# Altium integrated library LEMO Unipole And Multipole Type Connectors.IntLib: 1566 symbols (part 7 of 13) (continued)
## HEW.LF.368.XLNP
designator J?
Fixed receptacle, nut fixing for printed circuit, Key (W), LF series, Multipole Type with; Manufacturer: LEMO; PartNumber: HEW.LF.368.XLNP; Number of contacts: 0; Contact Diameter: 0.7 mm; Test voltage Contact-Contact(Kv rms): 1.5; Rate Current(A): 2.5; DatasheetVersion: Jun-14; PackageReference: HEW.LF.368.XLNP; PackageDescription: Fixed receptacle, nut fixing for printed circuit, watertight, Key(W) for Printed Circuit; Supplier 1: Mouser; Supplier Part Number 1: 736-HEWLF368XLNP; Supplier 2: Digi-Key; Supplier Part Number 2: HEW.LF.368.XLNP-ND; Test voltage Contact-Shell(Kv rms): 1.5; ComponentLink1Description: Manufacturer URL; ComponentLink1URL: http://www.lemo.com; ComponentLink2Description: Datasheet; ComponentLink2URL: http://intra.lemo.ch/catalog/ROW/UK_English/f_series.pdf
footprint HEW.LF.368.XLNP (Socket, Female, Through hole)
part A pins: 1, 2, 3, 4, 5, 6, 7, 8, 9, 10, 11, 12, 13, 14, 15, 16, 17, 18, 19, 20, 21, 22, 23, 24, 25, 26, 27, 28, 29, 30, 31, 32, 33, 34
part B pins: 35, 36, 37, 38, 39, 40, 41, 42, 43, 44, 45, 46, 47, 48, 49, 50, 51, 52, 53, 54, 55, 56, 57, 58, 59, 60, 61, 62, 63, 64, 65, 66, 67, 68, 70, 71, 72, 73

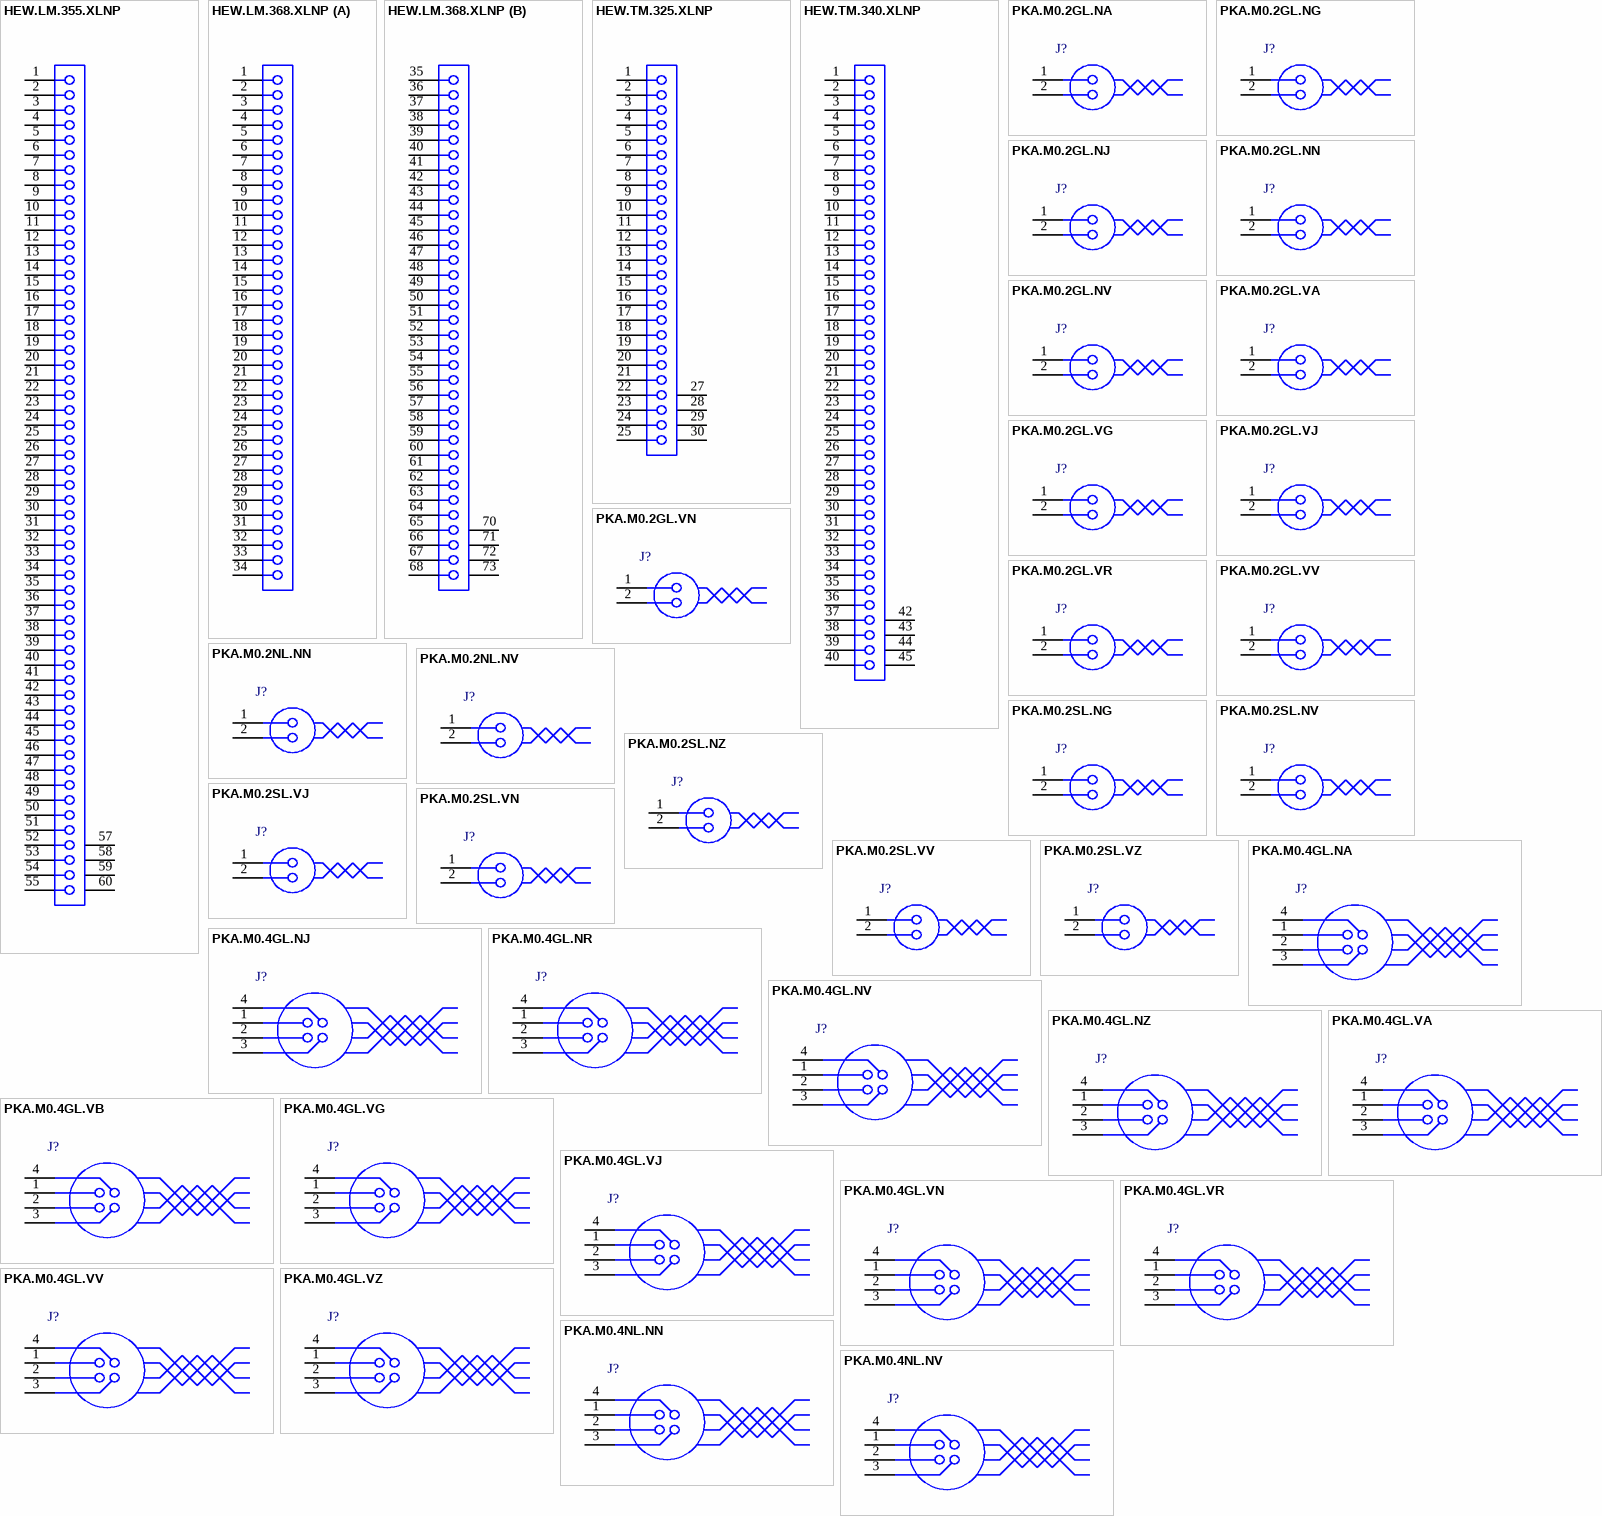
[diagram p23: symbols HEW.LM.355.XLNP to PKA.M0.4NL.NV]

## HEW.LM.355.XLNP
designator J?
Fixed receptacle, nut fixing for printed circuit, watertight, Key (W), LM series, Multipole Type with; Manufacturer: LEMO; PartNumber: HEW.LM.355.XLNP; Number of contacts: 0; Contact Diameter: 0.9 mm; Rated Current(A): 3.5; DatasheetVersion: Jun-14; PackageReference: HEW.LM.355.XLNP; PackageDescription: Fixed receptacle, nut fixing for printed circuit, watertight, Key(W) for Printed Circuit; Supplier 1: Mouser; Supplier Part Number 1: 736-HEWLM355XLNP; Supplier 2: Digi-Key; Supplier Part Number 2: HEW.LM.355.XLNP-ND; ComponentLink1Description: Manufacturer URL; ComponentLink1URL: http://www.lemo.com; ComponentLink2Description: Datasheet; ComponentLink2URL: http://intra.lemo.ch/catalog/ROW/UK_English/M_series.pdf
footprint HEW.LM.355.XLNP (Socket, Female, Body 28mm dia. Height 24.6 mm, Through hole)
pins: 1, 2, 3, 4, 5, 6, 7, 8, 9, 10, 11, 12, 13, 14, 15, 16, 17, 18, 19, 20, 21, 22, 23, 24, 25, 26, 27, 28, 29, 30, 31, 32, 33, 34, 35, 36, 37, 38, 39, 40, 41, 42, 43, 44, 45, 46, 47, 48, 49, 50, 51, 52, 53, 54, 55, 57, 58, 59, 60

## HEW.LM.368.XLNP
designator J?
Fixed receptacle, nut fixing for printed circuit, watertight, Key (W), LM series, Multipole Type with; Manufacturer: LEMO; PartNumber: HEW.LM.368.XLNP; Number of contacts: 0; Contact Diameter: 0.7 mm; AWG: 24; Rated Current(A): 2.5; DatasheetVersion: Jun-14; PackageReference: HEW.LM.368.XLNP; PackageDescription: Fixed receptacle, nut fixing for printed circuit, watertight, Key(W) for Printed Circuit; Supplier 1: Mouser; Supplier Part Number 1: 736-HEWLM368XLNP; Supplier 2: Digi-Key; Supplier Part Number 2: 1124-1201-ND; ComponentLink1Description: Manufacturer URL; ComponentLink1URL: http://www.lemo.com; ComponentLink2Description: Datasheet; ComponentLink2URL: http://intra.lemo.ch/catalog/ROW/UK_English/M_series.pdf
footprint HEW.LM.368.XLNP (Socket, Female, Body 28mm dia. Height 24.6 mm, Through hole)
part A pins: 1, 2, 3, 4, 5, 6, 7, 8, 9, 10, 11, 12, 13, 14, 15, 16, 17, 18, 19, 20, 21, 22, 23, 24, 25, 26, 27, 28, 29, 30, 31, 32, 33, 34
part B pins: 35, 36, 37, 38, 39, 40, 41, 42, 43, 44, 45, 46, 47, 48, 49, 50, 51, 52, 53, 54, 55, 56, 57, 58, 59, 60, 61, 62, 63, 64, 65, 66, 67, 68, 70, 71, 72, 73

## HEW.TM.325.XLNP
designator J?
Fixed receptacle, nut fixing for printed circuit, watertight, Key (W), TM series, Multipole Type with 25 Contacts; Manufacturer: LEMO; PartNumber: HEW.TM.325.XLNP; Number of contacts: 25; Contact Diameter: 0.9 mm; Rated Current(A): 5; DatasheetVersion: Jun-14; PackageReference: HEW.TM.325.XLNP; PackageDescription: Fixed receptacle, nut fixing for printed circuit, watertight, Key(W) for Printed Circuit; ComponentLink1Description: Manufacturer URL; ComponentLink1URL: http://www.lemo.com; ComponentLink2Description: Datasheet; ComponentLink2URL: http://intra.lemo.ch/catalog/ROW/UK_English/M_series.pdf
footprint HEW.TM.325.XLNP (Socket, Female, Body 22mm dia. Height 24.6 mm, Through hole)
pins: 1, 2, 3, 4, 5, 6, 7, 8, 9, 10, 11, 12, 13, 14, 15, 16, 17, 18, 19, 20, 21, 22, 23, 24, 25, 27, 28, 29, 30

## HEW.TM.340.XLNP
designator J?
Fixed receptacle, nut fixing for printed circuit, watertight, Key (W), TM series, Multipole Type with 40 Contacts; Manufacturer: LEMO; PartNumber: HEW.TM.340.XLNP; Number of contacts: 40; Contact Diameter: 0.7 mm; Rated Current(A): 3; DatasheetVersion: Jun-14; PackageReference: HEW.TM.340.XLNP; PackageDescription: Fixed receptacle, nut fixing for printed circuit, watertight, Key(W) for Printed Circuit; Supplier 1: Mouser; Supplier Part Number 1: 736-HEWTM340XLNP; Supplier 2: Digi-Key; Supplier Part Number 2: HEW.TM.340.XLNP-ND; ComponentLink1Description: Manufacturer URL; ComponentLink1URL: http://www.lemo.com; ComponentLink2Description: Datasheet; ComponentLink2URL: http://intra.lemo.ch/catalog/ROW/UK_English/M_series.pdf
footprint HEW.TM.340.XLNP (Socket, Female, Body 22mm dia. Height 24.6 mm, Through hole)
pins: 1, 2, 3, 4, 5, 6, 7, 8, 9, 10, 11, 12, 13, 14, 15, 16, 17, 18, 19, 20, 21, 22, 23, 24, 25, 26, 27, 28, 29, 30, 31, 32, 33, 34, 35, 36, 37, 38, 39, 40, 42, 43, 44, 45

## PKA.M0.2GL.NA
designator J?
Fixed receptacle with two nuts (back panel mounting), straight print contacts, Key (A), P series, Multipole Type with 2 Contacts; Manufacturer: LEMO; PartNumber: PKA.M0.2GL.NA; Number of contacts: 2; Contact Diameter: 1.3 mm; Test voltage (kV rms) Contact-Contact: 1.2; Rated Current(A): 10; DatasheetVersion: Jun-14; PackageReference: PKA.M0.2GL.NA; PackageDescription: Fixed receptacle with two nuts (back panel mounting), straight print contacts, Key(A) for Printed Circuit; ComponentLink1Description: Manufacturer URL; ComponentLink1URL: http://www.lemo.com; ComponentLink2Description: Datasheet; ComponentLink2URL: http://intra.lemo.ch/catalog/ROW/UK_English/P_series_catalog.pdf
footprint PKA.M0.2GL.NA (Socket, Female, Height 33.5 mm, Through hole)
pins: 1, 2

## PKA.M0.2GL.NG
designator J?
Fixed receptacle with two nuts (back panel mounting), straight print contacts, Key (A), P series, Multipole Type with 2 Contacts; Manufacturer: LEMO; PartNumber: PKA.M0.2GL.NG; Number of contacts: 2; Contact Diameter: 1.3 mm; Test voltage (kV rms) Contact-Contact: 1.2; Rated Current(A): 10; DatasheetVersion: Jun-14; PackageReference: PKA.M0.2GL.NG; PackageDescription: Fixed receptacle with two nuts (back panel mounting), straight print contacts, Key(A) for Printed Circuit; ComponentLink1Description: Manufacturer URL; ComponentLink1URL: http://www.lemo.com; ComponentLink2Description: Datasheet; ComponentLink2URL: http://intra.lemo.ch/catalog/ROW/UK_English/P_series_catalog.pdf
footprint PKA.M0.2GL.NG (Socket, Female, Height 33.5 mm, Through hole)
pins: 1, 2

## PKA.M0.2GL.NJ
designator J?
Fixed receptacle with two nuts (back panel mounting), straight print contacts, Key (A), P series, Multipole Type with 2 Contacts; Manufacturer: LEMO; PartNumber: PKA.M0.2GL.NJ; Number of contacts: 2; Contact Diameter: 1.3 mm; Test voltage (kV rms) Contact-Contact: 1.2; Rated Current(A): 10; DatasheetVersion: Jun-14; PackageReference: PKA.M0.2GL.NJ; PackageDescription: Fixed receptacle with two nuts (back panel mounting), straight print contacts, Key(A) for Printed Circuit; ComponentLink1Description: Manufacturer URL; ComponentLink1URL: http://www.lemo.com; ComponentLink2Description: Datasheet; ComponentLink2URL: http://intra.lemo.ch/catalog/ROW/UK_English/P_series_catalog.pdf
footprint PKA.M0.2GL.NJ (Socket, Female, Height 33.5 mm, Through hole)
pins: 1, 2

## PKA.M0.2GL.NN
designator J?
Fixed receptacle with two nuts (back panel mounting), straight print contacts, Key (A), P series, Multipole Type with 2 Contacts; Manufacturer: LEMO; PartNumber: PKA.M0.2GL.NN; Number of contacts: 2; Contact Diameter: 1.3 mm; Test voltage (kV rms) Contact-Contact: 1.2; Rated Current(A): 10; DatasheetVersion: Jun-14; PackageReference: PKA.M0.2GL.NN; PackageDescription: Fixed receptacle with two nuts (back panel mounting), straight print contacts, Key(A) for Printed Circuit; ComponentLink1Description: Manufacturer URL; ComponentLink1URL: http://www.lemo.com; ComponentLink2Description: Datasheet; ComponentLink2URL: http://intra.lemo.ch/catalog/ROW/UK_English/P_series_catalog.pdf
footprint PKA.M0.2GL.NN (Socket, Female, Height 33.5 mm, Through hole)
pins: 1, 2

## PKA.M0.2GL.NV
designator J?
Fixed receptacle with two nuts (back panel mounting), straight print contacts, Key (A),  series, Multipole Type with 2 Contacts; Manufacturer: LEMO; PartNumber: PKA.M0.2GL.NV; Number of contacts: 2; Contact Diameter: 1.3 mm; Test voltage (kV rms) Contact-Contact: 1.2; Rated Current(A): 10; DatasheetVersion: Jun-14; PackageReference: PKA.M0.2GL.NV; PackageDescription: Fixed receptacle with two nuts (back panel mounting), straight print contacts, Key(A) for Printed Circuit; ComponentLink1Description: Manufacturer URL; ComponentLink1URL: http://www.lemo.com; ComponentLink2Description: Datasheet; ComponentLink2URL: http://intra.lemo.ch/catalog/ROW/UK_English/P_series_catalog.pdf
footprint PKA.M0.2GL.NV (Socket, Female, Height 33.5 mm, Through hole)
pins: 1, 2

## PKA.M0.2GL.VA
designator J?
Fixed receptacle with two nuts (back panel mounting), 90° print contacts, Key (A), P series, Multipole Type with 2 Contacts; Manufacturer: LEMO; PartNumber: PKA.M0.2GL.VA; Number of contacts: 2; Contact Diameter: 1.3 mm; Test voltage (kV rms) Contact-Contact: 1.2; Rated Current(A): 10; DatasheetVersion: Jun-14; PackageReference: PKA.M0.2GL.VA; PackageDescription: Fixed receptacle with two nuts (back panel mounting), 90° print contacts, Key(A) for Printed Circuit; ComponentLink1Description: Manufacturer URL; ComponentLink1URL: http://www.lemo.com; ComponentLink2Description: Datasheet; ComponentLink2URL: http://intra.lemo.ch/catalog/ROW/UK_English/P_series_catalog.pdf
footprint PKA.M0.2GL.VA (Socket, Female, Height 33.5 mm, Through hole)
pins: 1, 2

## PKA.M0.2GL.VG
designator J?
Fixed receptacle with two nuts (back panel mounting), 90° print contacts, Key (A), P series, Multipole Type with 2 Contacts; Manufacturer: LEMO; PartNumber: PKA.M0.2GL.VG; Number of contacts: 2; Contact Diameter: 1.3 mm; Test voltage (kV rms) Contact-Contact: 1.2; Rated Current(A): 10; DatasheetVersion: Jun-14; PackageReference: PKA.M0.2GL.VG; PackageDescription: Fixed receptacle with two nuts (back panel mounting), 90° print contacts, Key(A) for Printed Circuit; ComponentLink1Description: Manufacturer URL; ComponentLink1URL: http://www.lemo.com; ComponentLink2Description: Datasheet; ComponentLink2URL: http://intra.lemo.ch/catalog/ROW/UK_English/P_series_catalog.pdf
footprint PKA.M0.2GL.VG (Socket, Female, Height 33.5 mm, Through hole)
pins: 1, 2

## PKA.M0.2GL.VJ
designator J?
Fixed receptacle with two nuts (back panel mounting), 90° print contacts, Key (A), P series, Multipole Type with 2 Contacts; Manufacturer: LEMO; PartNumber: PKA.M0.2GL.VJ; Number of contacts: 2; Contact Diameter: 1.3 mm; Test voltage (kV rms) Contact-Contact: 1.2; Rated Current(A): 10; DatasheetVersion: Jun-14; PackageReference: PKA.M0.2GL.VJ; PackageDescription: Fixed receptacle with two nuts (back panel mounting), 90° print contacts, Key(A) for Printed Circuit; ComponentLink1Description: Manufacturer URL; ComponentLink1URL: http://www.lemo.com; ComponentLink2Description: Datasheet; ComponentLink2URL: http://intra.lemo.ch/catalog/ROW/UK_English/P_series_catalog.pdf
footprint PKA.M0.2GL.VJ (Socket, Female, Height 33.5 mm, Through hole)
pins: 1, 2

## PKA.M0.2GL.VN
designator J?
Fixed receptacle with two nuts (back panel mounting), 90° print contacts, Key (A), P series, Multipole Type with 2 Contacts; Manufacturer: LEMO; PartNumber: PKA.M0.2GL.VN; Number of contacts: 2; Contact Diameter: 1.3 mm; Test voltage (kV rms) Contact-Contact: 1.2; Rated Current(A): 10; DatasheetVersion: Jun-14; PackageReference: PKA.M0.2GL.VN; PackageDescription: Fixed receptacle with two nuts (back panel mounting), 90° print contacts, Key(A) for Printed Circuit; ComponentLink1Description: Manufacturer URL; ComponentLink1URL: http://www.lemo.com; ComponentLink2Description: Datasheet; ComponentLink2URL: http://intra.lemo.ch/catalog/ROW/UK_English/P_series_catalog.pdf
footprint PKA.M0.2GL.VN (Socket, Female, Height 33.5 mm, Through hole)
pins: 1, 2

## PKA.M0.2GL.VR
designator J?
Fixed receptacle with two nuts (back panel mounting), 90° print contacts, Key (A), P series, Multipole Type with 2 Contacts; Manufacturer: LEMO; PartNumber: PKA.M0.2GL.VR; Number of contacts: 2; Contact Diameter: 1.3 mm; Test voltage (kV rms) Contact-Contact: 1.2; Rated Current(A): 10; DatasheetVersion: Jun-14; PackageReference: PKA.M0.2GL.VR; PackageDescription: Fixed receptacle with two nuts (back panel mounting), 90° print contacts, Key(A) for Printed Circuit; ComponentLink1Description: Manufacturer URL; ComponentLink1URL: http://www.lemo.com; ComponentLink2Description: Datasheet; ComponentLink2URL: http://intra.lemo.ch/catalog/ROW/UK_English/P_series_catalog.pdf
footprint PKA.M0.2GL.VR (Socket, Female, Height 33.5 mm, Through hole)
pins: 1, 2

## PKA.M0.2GL.VV
designator J?
Fixed receptacle with two nuts (back panel mounting), 90° print contacts, Key (A), P series, Multipole Type with 2 Contacts; Manufacturer: LEMO; PartNumber: PKA.M0.2GL.VV; Number of contacts: 2; Contact Diameter: 1.3 mm; Test voltage (kV rms) Contact-Contact: 1.2; Rated Current(A): 10; DatasheetVersion: Jun-14; PackageReference: PKA.M0.2GL.VV; PackageDescription: Fixed receptacle with two nuts (back panel mounting), 90° print contacts, Key(A) for Printed Circuit; ComponentLink1Description: Manufacturer URL; ComponentLink1URL: http://www.lemo.com; ComponentLink2Description: Datasheet; ComponentLink2URL: http://intra.lemo.ch/catalog/ROW/UK_English/P_series_catalog.pdf
footprint PKA.M0.2GL.VV (Socket, Female, Height 33.5 mm, Through hole)
pins: 1, 2

## PKA.M0.2NL.NN
designator J?
Fixed receptacle with two nuts (back panel mounting), straight print contacts, Key (A), P series, Multipole Type with 2 Contacts; Manufacturer: LEMO; PartNumber: PKA.M0.2NL.NN; Number of contacts: 2; Contact Diameter: 1.3 mm; Test voltage (kV rms) Contact-Contact: 1.2; Rated Current(A): 10; DatasheetVersion: Jun-14; PackageReference: PKA.M0.2NL.NN; PackageDescription: Fixed receptacle with two nuts (back panel mounting), straight print contacts, Key(A) for Printed Circuit; ComponentLink1Description: Manufacturer URL; ComponentLink1URL: http://www.lemo.com; ComponentLink2Description: Datasheet; ComponentLink2URL: http://intra.lemo.ch/catalog/ROW/UK_English/P_series_catalog.pdf
footprint PKA.M0.2NL.NN (Socket, Female, Height 33.5 mm, Through hole)
pins: 1, 2

## PKA.M0.2NL.NV
designator J?
Fixed receptacle with two nuts (back panel mounting), straight print contacts, Key (A), P series, Multipole Type with 2 Contacts; Manufacturer: LEMO; PartNumber: PKA.M0.2NL.NV; Number of contacts: 2; Contact Diameter: 1.3 mm; Test voltage (kV rms) Contact-Contact: 1.2; Rated Current(A): 10; DatasheetVersion: Jun-14; PackageReference: PKA.M0.2NL.NV; PackageDescription: Fixed receptacle with two nuts (back panel mounting), straight print contacts, Key(A) for Printed Circuit; ComponentLink1Description: Manufacturer URL; ComponentLink1URL: http://www.lemo.com; ComponentLink2Description: Datasheet; ComponentLink2URL: http://intra.lemo.ch/catalog/ROW/UK_English/P_series_catalog.pdf
footprint PKA.M0.2NL.NV (Socket, Female, Height 33.5 mm, Through hole)
pins: 1, 2

## PKA.M0.2SL.NG
designator J?
Fixed receptacle with two nuts (back panel mounting), straight print contacts, Key (A), P series, Multipole Type with 2 Contacts; Manufacturer: LEMO; PartNumber: PKA.M0.2SL.NG; Number of contacts: 2; Contact Diameter: 1.3 mm; Test voltage (kV rms) Contact-Contact: 1.2; Rated Current(A): 10; DatasheetVersion: Jun-14; PackageReference: PKA.M0.2SL.NG; PackageDescription: Fixed receptacle with two nuts (back panel mounting), straight print contacts, Key(A) for Printed Circuit; ComponentLink1Description: Manufacturer URL; ComponentLink1URL: http://www.lemo.com; ComponentLink2Description: Datasheet; ComponentLink2URL: http://intra.lemo.ch/catalog/ROW/UK_English/P_series_catalog.pdf
footprint PKA.M0.2SL.NG (Socket, Female, Height 33.5 mm, Through hole)
pins: 1, 2

## PKA.M0.2SL.NV
designator J?
Fixed receptacle with two nuts (back panel mounting), straight print contacts, Key (A), P series, Multipole Type with 2 Contacts; Manufacturer: LEMO; PartNumber: PKA.M0.2SL.NV; Number of contacts: 2; Contact Diameter: 1.3 mm; Test voltage (kV rms) Contact-Contact: 1.2; Rated Current(A): 10; DatasheetVersion: Jun-14; PackageReference: PKA.M0.2SL.NV; PackageDescription: Fixed receptacle with two nuts (back panel mounting), straight print contacts, Key(A) for Printed Circuit; ComponentLink1Description: Manufacturer URL; ComponentLink1URL: http://www.lemo.com; ComponentLink2Description: Datasheet; ComponentLink2URL: http://intra.lemo.ch/catalog/ROW/UK_English/P_series_catalog.pdf
footprint PKA.M0.2SL.NV (Socket, Female, Height 33.5 mm, Through hole)
pins: 1, 2

## PKA.M0.2SL.NZ
designator J?
Fixed receptacle with 1 nut (without 2nd front nut), Key (A), P series, Multipole Type with 2 Contacts; Manufacturer: LEMO; PartNumber: PKA.M0.2SL.NZ; Number of contacts: 2; Contact Diameter: 1.3 mm; Test voltage (kV rms) Contact-Contact: 1.2; Rated Current(A): 10; DatasheetVersion: Jun-14; PackageReference: PKA.M0.2SL.NZ; PackageDescription: Fixed receptacle with 1 nut (without 2nd front nut), Key(A) for Printed Circuit; Supplier 1: Mouser; Supplier Part Number 1: 736-PKAM02SLNZ; Supplier 2: Digi-Key; Supplier Part Number 2: PKA.M0.2SL.NZ-ND; ComponentLink1Description: Manufacturer URL; ComponentLink1URL: http://www.lemo.com; ComponentLink2Description: Datasheet; ComponentLink2URL: http://intra.lemo.ch/catalog/ROW/UK_English/P_series_catalog.pdf
footprint PKA.M0.2SL.NZ (Socket, Female, Height 25 mm, Through hole)
pins: 1, 2

## PKA.M0.2SL.VJ
designator J?
Fixed receptacle with two nuts (back panel mounting), 90° print contacts, Key (A), P series, Multipole Type with 2 Contacts; Manufacturer: LEMO; PartNumber: PKA.M0.2SL.VJ; Number of contacts: 2; Contact Diameter: 1.3 mm; Test voltage (kV rms) Contact-Contact: 1.2; Rated Current(A): 10; DatasheetVersion: Jun-14; PackageReference: PKA.M0.2SL.VJ; PackageDescription: Fixed receptacle with two nuts (back panel mounting), 90° print contacts, Key(A) for Printed Circuit; ComponentLink1Description: Manufacturer URL; ComponentLink1URL: http://www.lemo.com; ComponentLink2Description: Datasheet; ComponentLink2URL: http://intra.lemo.ch/catalog/ROW/UK_English/P_series_catalog.pdf
footprint PKA.M0.2SL.VJ (Socket, Female, Through hole)
pins: 1, 2

## PKA.M0.2SL.VN
designator J?
Fixed receptacle with two nuts (back panel mounting), 90° print contacts, Key (A), P series, Multipole Type with 2 Contacts; Manufacturer: LEMO; PartNumber: PKA.M0.2SL.VN; Number of contacts: 2; Contact Diameter: 1.3 mm; Test voltage (kV rms) Contact-Contact: 1.2; Rated Current(A): 10; DatasheetVersion: Jun-14; PackageReference: PKA.M0.2SL.VN; PackageDescription: Fixed receptacle with two nuts (back panel mounting), 90° print contacts, Key(A) for Printed Circuit; Supplier 1: Mouser; Supplier Part Number 1: 736-PKAM02SLVN; Supplier 2: Digi-Key; Supplier Part Number 2: PKA.M0.2SL.VN-ND; ComponentLink1Description: Manufacturer URL; ComponentLink1URL: http://www.lemo.com; ComponentLink2Description: Datasheet; ComponentLink2URL: http://intra.lemo.ch/catalog/ROW/UK_English/P_series_catalog.pdf
footprint PKA.M0.2SL.VN (Socket, Female, Height 33.5 mm, Through hole)
pins: 1, 2

## PKA.M0.2SL.VV
designator J?
Fixed receptacle with two nuts (back panel mounting), 90° print contacts, Key (A), P series, Multipole Type with 2 Contacts; Manufacturer: LEMO; PartNumber: PKA.M0.2SL.VV; Number of contacts: 2; Contact Diameter: 1.3 mm; Test voltage (kV rms) Contact-Contact: 1.2; Rated Current(A): 10; DatasheetVersion: Jun-14; PackageReference: PKA.M0.2SL.VV; PackageDescription: Fixed receptacle with two nuts (back panel mounting), 90° print contacts, Key(A) for Printed Circuit; ComponentLink1Description: Manufacturer URL; ComponentLink1URL: http://www.lemo.com; ComponentLink2Description: Datasheet; ComponentLink2URL: http://intra.lemo.ch/catalog/ROW/UK_English/P_series_catalog.pdf
footprint PKA.M0.2SL.VV (Socket, Female, Height 33.5 mm, Through hole)
pins: 1, 2

## PKA.M0.2SL.VZ
designator J?
Fixed receptacle with 1 nut (without 2nd front nut), Key (A), P series, Multipole Type with 2 Contacts; Manufacturer: LEMO; PartNumber: PKA.M0.2SL.VZ; Number of contacts: 2; Contact Diameter: 1.3 mm; Test voltage (kV rms) Contact-Contact: 1.2; Rated Current(A): 10; DatasheetVersion: Jun-14; PackageReference: PKA.M0.2SL.VZ; PackageDescription: Fixed receptacle with 1 nut (without 2nd front nut), Key(A) for Printed Circuit; ComponentLink1Description: Manufacturer URL; ComponentLink1URL: http://www.lemo.com; ComponentLink2Description: Datasheet; ComponentLink2URL: http://intra.lemo.ch/catalog/ROW/UK_English/P_series_catalog.pdf
footprint PKA.M0.2SL.VZ (Socket, Female, Height 33.5 mm, Through hole)
pins: 1, 2

## PKA.M0.4GL.NA
designator J?
Fixed receptacle with two nuts (back panel mounting), straight print contacts, Key (A), P series, Multipole Type with 4 Contacts; Manufacturer: LEMO; PartNumber: PKA.M0.4GL.NA; Number of contacts: 4; Contact Diameter: 0.9 mm; Test voltage (kV rms) Contact-Contact: 1.2; Rated Current(A): 8; DatasheetVersion: Jun-14; PackageReference: PKA.M0.4GL.NA; PackageDescription: Fixed receptacle with two nuts (back panel mounting), straight print contacts, Key(A) for Printed Circuit; ComponentLink1Description: Manufacturer URL; ComponentLink1URL: http://www.lemo.com; ComponentLink2Description: Datasheet; ComponentLink2URL: http://intra.lemo.ch/catalog/ROW/UK_English/P_series_catalog.pdf
footprint PKA.M0.4GL.NA (Socket, Female, Height 33.5 mm, Through hole)
pins: 1, 2, 3, 4

## PKA.M0.4GL.NJ
designator J?
Fixed receptacle with two nuts (back panel mounting), straight print contacts, Key (A), P series, Multipole Type with 4 Contacts; Manufacturer: LEMO; PartNumber: PKA.M0.4GL.NJ; Number of contacts: 4; Contact Diameter: 0.9 mm; Test voltage (kV rms) Contact-Contact: 1.2; Rated Current(A): 8; DatasheetVersion: Jun-14; PackageReference: PKA.M0.4GL.NJ; PackageDescription: Fixed receptacle with two nuts (back panel mounting), straight print contacts, Key(A) for Printed Circuit; ComponentLink1Description: Manufacturer URL; ComponentLink1URL: http://www.lemo.com; ComponentLink2Description: Datasheet; ComponentLink2URL: http://intra.lemo.ch/catalog/ROW/UK_English/P_series_catalog.pdf
footprint PKA.M0.4GL.NJ (Socket, Female, Height 33.5 mm, Through hole)
pins: 1, 2, 3, 4

## PKA.M0.4GL.NR
designator J?
Fixed receptacle with two nuts (back panel mounting), straight print contacts, Key (A), P series, Multipole Type with 4 Contacts; Manufacturer: LEMO; PartNumber: PKA.M0.4GL.NR; Number of contacts: 4; Contact Diameter: 0.9 mm; Test voltage (kV rms) Contact-Contact: 1.2; Rated Current(A): 8; DatasheetVersion: Jun-14; PackageReference: PKA.M0.4GL.NR; PackageDescription: Fixed receptacle with two nuts (back panel mounting), straight print contacts, Key(A) for Printed Circuit; ComponentLink1Description: Manufacturer URL; ComponentLink1URL: http://www.lemo.com; ComponentLink2Description: Datasheet; ComponentLink2URL: http://intra.lemo.ch/catalog/ROW/UK_English/P_series_catalog.pdf
footprint PKA.M0.4GL.NR (Socket, Female, Height 33.5 mm, Through hole)
pins: 1, 2, 3, 4

## PKA.M0.4GL.NV
designator J?
Fixed receptacle with two nuts (back panel mounting), straight print contacts, Key (A), P series, Multipole Type with 4 Contacts; Manufacturer: LEMO; PartNumber: PKA.M0.4GL.NV; Number of contacts: 4; Contact Diameter: 0.9 mm; Test voltage (kV rms) Contact-Contact: 1.2; Rated Current(A): 8; DatasheetVersion: Jun-14; PackageReference: PKA.M0.4GL.NV; PackageDescription: Fixed receptacle with two nuts (back panel mounting), straight print contacts, Key(A) for Printed Circuit; ComponentLink1Description: Manufacturer URL; ComponentLink1URL: http://www.lemo.com; ComponentLink2Description: Datasheet; ComponentLink2URL: http://intra.lemo.ch/catalog/ROW/UK_English/P_series_catalog.pdf
footprint PKA.M0.4GL.NV (Socket, Female, Height 33.5 mm, Through hole)
pins: 1, 2, 3, 4

## PKA.M0.4GL.NZ
designator J?
Fixed receptacle with 1 nut (without 2nd front nut), Key (A), P series, Multipole Type with 4 Contacts; Manufacturer: LEMO; PartNumber: PKA.M0.4GL.NZ; Number of contacts: 4; Contact Diameter: 0.9 mm; Test voltage (kV rms) Contact-Contact: 1.2; Rated Current(A): 8; DatasheetVersion: Jun-14; PackageReference: PKA.M0.4GL.NZ; PackageDescription: Fixed receptacle with 1 nut (without 2nd front nut), Key(A) for Printed Circuit; ComponentLink1Description: Manufacturer URL; ComponentLink1URL: http://www.lemo.com; ComponentLink2Description: Datasheet; ComponentLink2URL: http://intra.lemo.ch/catalog/ROW/UK_English/P_series_catalog.pdf
footprint PKA.M0.4GL.NZ (Socket, Female, Height 25 mm, Through hole)
pins: 1, 2, 3, 4

## PKA.M0.4GL.VA
designator J?
Fixed receptacle with two nuts (back panel mounting), 90° print contacts, Key (A), P series, Multipole Type with 4 Contacts; Manufacturer: LEMO; PartNumber: PKA.M0.4GL.VA; Number of contacts: 4; Contact Diameter: 0.9 mm; Test voltage (kV rms) Contact-Contact: 1.2; Rated Current(A): 8; DatasheetVersion: Jun-14; PackageReference: PKA.M0.4GL.VA; PackageDescription: Fixed receptacle with two nuts (back panel mounting), 90° print contacts, Key(A) for Printed Circuit; ComponentLink1Description: Manufacturer URL; ComponentLink1URL: http://www.lemo.com; ComponentLink2Description: Datasheet; ComponentLink2URL: http://intra.lemo.ch/catalog/ROW/UK_English/P_series_catalog.pdf
footprint PKA.M0.4GL.VA (Socket, Female, Height 33.5 mm, Through hole)
pins: 1, 2, 3, 4
